# Altium schematic symbol library Molex FFC - FPC Connectors (SMT).SchLib: 638 symbols (part 10 of 10)
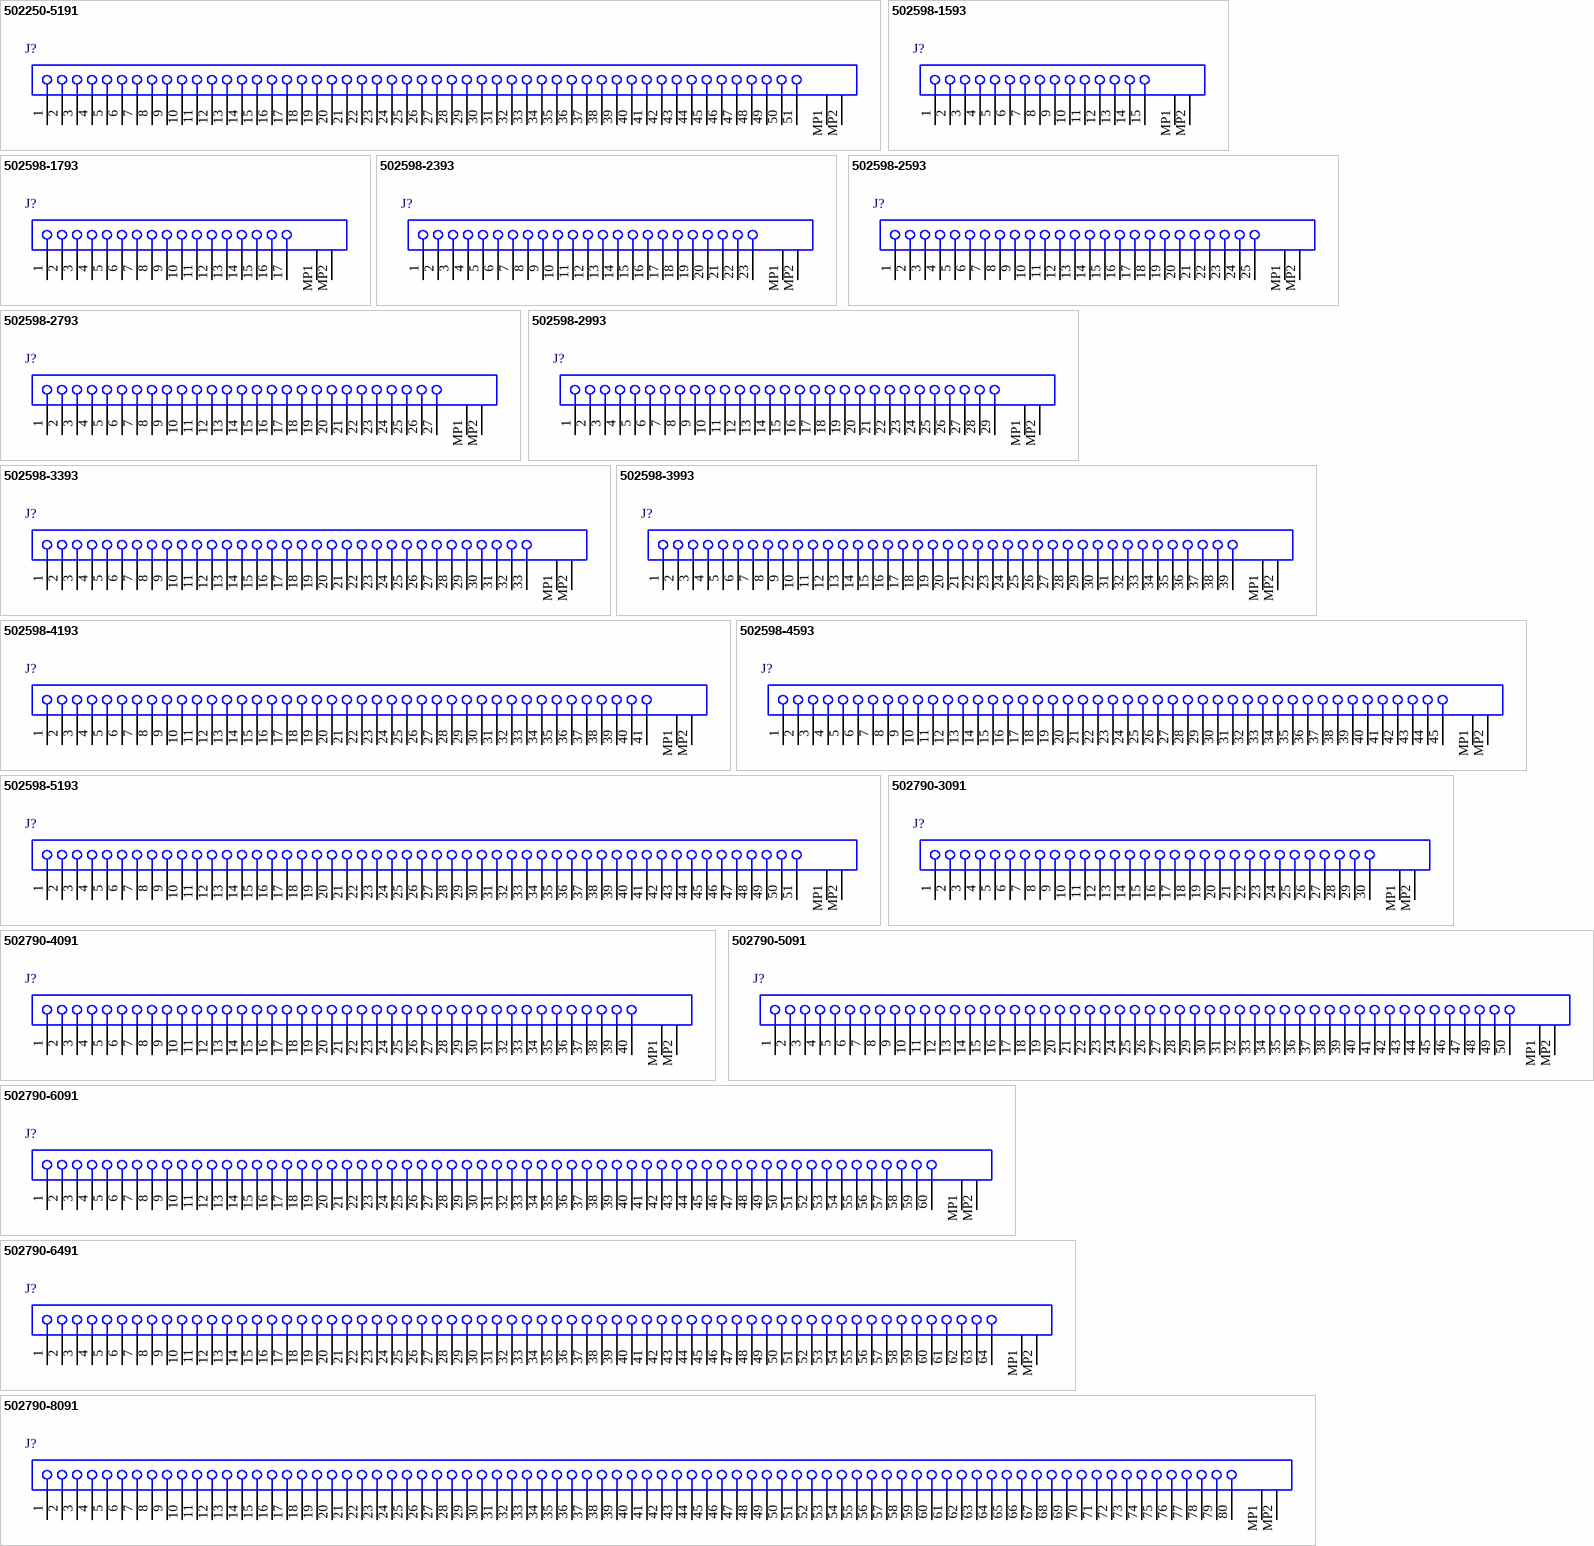
[diagram p30: symbols 502250-5191 to 502790-8091]

## 502598-5193
designator J?
0.3 mm Pitch Easy-On(TM) BackFlip(TM) Type FPC Connector, 1.15 mm Mated Height, Right Angle, SMT, Dual Contact, 51 Circuits, -40 to 85 degC, ELV and RoHS Compliant, Tape and Reel; Manufacturer: Molex; PartNumber: 502598-5193; Circuits (Loaded): 51; Current (Max per Contact): 0.2A; Durability (mating cycles max): 10; Entry Angle: 90degrees Angle; Mated Height: 1.15mm; Material - Metal: Copper Alloy, Phosphor Bronze; Material - Plating Mating: Gold; Material - Plating Termination: Gold, Tin; PCB Locator: No; PCB Retention: Yes; Pitch - Mating Interface: 0.30mm; Voltage (Max): 50V AC (RMS)/DC; PackageVersion: Rev. B, 08/2013; PackageReference: 502598-5193; PackageDescription: 51-Lead FPC Connector, Pitch 0.3 mm; Contact Position: Dual; Number of Rows: 1; Orientation: Right Angle; Packing: Tape and Reel; Polarized to PCB: Yes; RoHS: TRUE; Stackable: No; Mounting Technology: Surface Mount; ComponentLink1Description: Manufacturer URL; ComponentLink1URL: http://www.molex.com/molex/index.jsp; ComponentLink2Description: Datasheet; ComponentLink2URL: http://www.molex.com/webdocs/datasheets/pdf/en-us/5025985193_FFC_FPC_CONNECTORS.pdf; ComponentLink3Description: Package Specification; ComponentLink3URL: http://www.molex.com/pdm_docs/sd/5025985193_sd.pdf
footprint MOLX-502598-5193 (FPC Connector, 51-Leads, Right Angle, Pitch 0.3 mm, Mated Height 1.15 mm, SMT)
pins: 1, 2, 3, 4, 5, 6, 7, 8, 9, 10, 11, 12, 13, 14, 15, 16, 17, 18, 19, 20, 21, 22, 23, 24, 25, 26, 27, 28, 29, 30, 31, 32, 33, 34, 35, 36, 37, 38, 39, 40, 41, 42, 43, 44, 45, 46, 47, 48, 49, 50, 51, MP1, MP2

## 502790-3091
designator J?
0.5 mm Pitch Easy-On(TM) Front Flip Type FPC Connector, 2.5 mm Mated Height, Right Angle, ZIF, SMT, Bottom Contact, 30 Circuits, -20 to 85 degC, ELV and RoHS Compliant, Tape and Reel; Manufacturer: Molex; PartNumber: 502790-3091; Circuits (Loaded): 30; Current (Max per Contact): 0.5A; Entry Angle: 90degrees Angle; Mated Height: 2.50mm; Material - Metal: Phosphor Bronze; Material - Plating Mating: Gold; PCB Retention: Yes; Pitch - Mating Interface: 0.50mm; Stackable: No; Voltage (Max): 50V; PackageVersion: Rev. C, 05/2009; PackageReference: 502790-3091; PackageDescription: 30-Lead FPC Connector, Pitch 0.5 mm; Contact Position: Bottom; Material - Plating Termination: Gold; Number of Rows: 1; Orientation: Right Angle; Packing: Tape and Reel; Polarized to PCB: Yes; RoHS: TRUE; Mounting Technology: Surface Mount; ComponentLink1Description: Manufacturer URL; ComponentLink1URL: http://www.molex.com/molex/index.jsp; ComponentLink2Description: Datasheet; ComponentLink2URL: http://www.molex.com/webdocs/datasheets/pdf/en-us/5027903091_FFC_FPC_CONNECTORS.pdf; ComponentLink3Description: Package Specification; ComponentLink3URL: http://www.molex.com/pdm_docs/sd/5027903091_sd.pdf
footprint MOLX-502790-3091 (FPC Connector, 30-Leads, Right Angle, Pitch 0.5 mm, Mated Height 2.5 mm, SMT)
pins: 1, 2, 3, 4, 5, 6, 7, 8, 9, 10, 11, 12, 13, 14, 15, 16, 17, 18, 19, 20, 21, 22, 23, 24, 25, 26, 27, 28, 29, 30, MP1, MP2

## 502790-4091
designator J?
0.5 mm Pitch Easy-On(TM) Front Flip Type FPC Connector, 2.5 mm Mated Height, Right Angle, ZIF, SMT, Bottom Contact, 40 Circuits, -20 to 85 degC, ELV and RoHS Compliant, Tape and Reel; Manufacturer: Molex; PartNumber: 502790-4091; Circuits (Loaded): 40; Current (Max per Contact): 0.5A; Entry Angle: 90degrees Angle; Mated Height: 2.50mm; Material - Metal: Phosphor Bronze; Material - Plating Mating: Gold; PCB Retention: Yes; Pitch - Mating Interface: 0.50mm; Stackable: No; Voltage (Max): 50V; PackageVersion: Rev. C, 05/2009; PackageReference: 502790-4091; PackageDescription: 40-Lead FPC Connector, Pitch 0.5 mm; Contact Position: Bottom; Material - Plating Termination: Gold; Number of Rows: 1; Orientation: Right Angle; Packing: Tape and Reel; Polarized to PCB: Yes; RoHS: TRUE; Mounting Technology: Surface Mount; ComponentLink1Description: Manufacturer URL; ComponentLink1URL: http://www.molex.com/molex/index.jsp; ComponentLink2Description: Datasheet; ComponentLink2URL: http://www.molex.com/webdocs/datasheets/pdf/en-us/5027904091_FFC_FPC_CONNECTORS.pdf; ComponentLink3Description: Package Specification; ComponentLink3URL: http://www.molex.com/pdm_docs/sd/5027904091_sd.pdf
footprint MOLX-502790-4091 (FPC Connector, 40-Leads, Right Angle, Pitch 0.5 mm, Mated Height 2.5 mm, SMT)
pins: 1, 2, 3, 4, 5, 6, 7, 8, 9, 10, 11, 12, 13, 14, 15, 16, 17, 18, 19, 20, 21, 22, 23, 24, 25, 26, 27, 28, 29, 30, 31, 32, 33, 34, 35, 36, 37, 38, 39, 40, MP1, MP2

## 502790-5091
designator J?
0.5 mm Pitch Easy-On(TM) Front Flip Type FPC Connector, 2.5 mm Mated Height, Right Angle, ZIF, SMT, Bottom Contact, 50 Circuits, -20 to 85 degC, ELV and RoHS Compliant, Tape and Reel; Manufacturer: Molex; PartNumber: 502790-5091; Circuits (Loaded): 50; Current (Max per Contact): 0.5A; Entry Angle: 90degrees Angle; Mated Height: 2.50mm; Material - Metal: Phosphor Bronze; Material - Plating Mating: Gold; PCB Retention: Yes; Pitch - Mating Interface: 0.50mm; Stackable: No; Voltage (Max): 50V; PackageVersion: Rev. C, 05/2009; PackageReference: 502790-5091; PackageDescription: 50-Lead FPC Connector, Pitch 0.5 mm; Contact Position: Bottom; Material - Plating Termination: Gold; Number of Rows: 1; Orientation: Right Angle; Packing: Tape and Reel; Polarized to PCB: Yes; RoHS: TRUE; Mounting Technology: Surface Mount; ComponentLink1Description: Manufacturer URL; ComponentLink1URL: http://www.molex.com/molex/index.jsp; ComponentLink2Description: Datasheet; ComponentLink2URL: http://www.molex.com/webdocs/datasheets/pdf/en-us/5027905091_FFC_FPC_CONNECTORS.pdf; ComponentLink3Description: Package Specification; ComponentLink3URL: http://www.molex.com/pdm_docs/sd/5027905091_sd.pdf
footprint MOLX-502790-5091 (FPC Connector, 50-Leads, Right Angle, Pitch 0.5 mm, Mated Height 2.5 mm, SMT)
pins: 1, 2, 3, 4, 5, 6, 7, 8, 9, 10, 11, 12, 13, 14, 15, 16, 17, 18, 19, 20, 21, 22, 23, 24, 25, 26, 27, 28, 29, 30, 31, 32, 33, 34, 35, 36, 37, 38, 39, 40, 41, 42, 43, 44, 45, 46, 47, 48, 49, 50, MP1, MP2

## 502790-6091
designator J?
0.5 mm Pitch Easy-On(TM) Front Flip Type FPC Connector, 2.5 mm Mated Height, Right Angle, ZIF, SMT, Bottom Contact, 60 Circuits, -20 to 85 degC, ELV and RoHS Compliant, Tape and Reel; Manufacturer: Molex; PartNumber: 502790-6091; Circuits (Loaded): 60; Current (Max per Contact): 0.5A; Entry Angle: 90degrees Angle; Mated Height: 2.50mm; Material - Metal: Phosphor Bronze; Material - Plating Mating: Gold; PCB Retention: Yes; Pitch - Mating Interface: 0.50mm; Stackable: No; Voltage (Max): 50V; PackageVersion: Rev. C, 05/2009; PackageReference: 502790-6091; PackageDescription: 60-Lead FPC Connector, Pitch 0.5 mm; Contact Position: Bottom; Material - Plating Termination: Gold; Number of Rows: 1; Orientation: Right Angle; Packing: Tape and Reel; Polarized to PCB: Yes; RoHS: TRUE; Mounting Technology: Surface Mount; ComponentLink1Description: Manufacturer URL; ComponentLink1URL: http://www.molex.com/molex/index.jsp; ComponentLink2Description: Datasheet; ComponentLink2URL: http://www.molex.com/webdocs/datasheets/pdf/en-us/5027906091_FFC_FPC_CONNECTORS.pdf; ComponentLink3Description: Package Specification; ComponentLink3URL: http://www.molex.com/pdm_docs/sd/5027906091_sd.pdf
footprint MOLX-502790-6091 (FPC Connector, 60-Leads, Right Angle, Pitch 0.5 mm, Mated Height 2.5 mm, SMT)
pins: 1, 2, 3, 4, 5, 6, 7, 8, 9, 10, 11, 12, 13, 14, 15, 16, 17, 18, 19, 20, 21, 22, 23, 24, 25, 26, 27, 28, 29, 30, 31, 32, 33, 34, 35, 36, 37, 38, 39, 40, 41, 42, 43, 44, 45, 46, 47, 48, 49, 50, 51, 52, 53, 54, 55, 56, 57, 58, 59, 60, MP1, MP2

## 502790-6491
designator J?
0.5 mm Pitch Easy-On(TM) Front Flip Type FPC Connector, 2.5 mm Mated Height, Right Angle, ZIF, SMT, Bottom Contact, 64 Circuits, -20 to 85 degC, ELV and RoHS Compliant, Tape and Reel; Manufacturer: Molex; PartNumber: 502790-6491; Circuits (Loaded): 64; Current (Max per Contact): 0.5A; Entry Angle: 90degrees Angle; Mated Height: 2.50mm; Material - Metal: Phosphor Bronze; Material - Plating Mating: Gold; PCB Retention: Yes; Pitch - Mating Interface: 0.50mm; Stackable: No; Voltage (Max): 50V; PackageVersion: Rev. C, 05/2009; PackageReference: 502790-6491; PackageDescription: 64-Lead FPC Connector, Pitch 0.5 mm; Contact Position: Bottom; Material - Plating Termination: Gold; Number of Rows: 1; Orientation: Right Angle; Packing: Tape and Reel; Polarized to PCB: Yes; RoHS: TRUE; Mounting Technology: Surface Mount; ComponentLink1Description: Manufacturer URL; ComponentLink1URL: http://www.molex.com/molex/index.jsp; ComponentLink2Description: Datasheet; ComponentLink2URL: http://www.molex.com/webdocs/datasheets/pdf/en-us/5027906491_FFC_FPC_CONNECTORS.pdf; ComponentLink3Description: Package Specification; ComponentLink3URL: http://www.molex.com/pdm_docs/sd/5027906491_sd.pdf
footprint MOLX-502790-6491 (FPC Connector, 64-Leads, Right Angle, Pitch 0.5 mm, Mated Height 2.5 mm, SMT)
pins: 1, 2, 3, 4, 5, 6, 7, 8, 9, 10, 11, 12, 13, 14, 15, 16, 17, 18, 19, 20, 21, 22, 23, 24, 25, 26, 27, 28, 29, 30, 31, 32, 33, 34, 35, 36, 37, 38, 39, 40, 41, 42, 43, 44, 45, 46, 47, 48, 49, 50, 51, 52, 53, 54, 55, 56, 57, 58, 59, 60, 61, 62, 63, 64, MP1, MP2

## 502790-8091
designator J?
0.5 mm Pitch Easy-On(TM) Front Flip Type FPC Connector, 2.5 mm Mated Height, Right Angle, ZIF, SMT, Bottom Contact, 80 Circuits, -20 to 85 degC, ELV and RoHS Compliant, Tape and Reel; Manufacturer: Molex; PartNumber: 502790-8091; Circuits (Loaded): 80; Current (Max per Contact): 0.5A; Entry Angle: 90degrees Angle; Mated Height: 2.50mm; Material - Metal: Phosphor Bronze; Material - Plating Mating: Gold; PCB Retention: Yes; Pitch - Mating Interface: 0.50mm; Stackable: No; Voltage (Max): 50V; PackageVersion: Rev. C, 05/2009; PackageReference: 502790-8091; PackageDescription: 80-Lead FPC Connector, Pitch 0.5 mm; Contact Position: Bottom; Material - Plating Termination: Gold; Number of Rows: 1; Orientation: Right Angle; Packing: Tape and Reel; Polarized to PCB: Yes; RoHS: TRUE; Mounting Technology: Surface Mount; ComponentLink1Description: Manufacturer URL; ComponentLink1URL: http://www.molex.com/molex/index.jsp; ComponentLink2Description: Datasheet; ComponentLink2URL: http://www.molex.com/webdocs/datasheets/pdf/en-us/5027908091_FFC_FPC_CONNECTORS.pdf; ComponentLink3Description: Package Specification; ComponentLink3URL: http://www.molex.com/pdm_docs/sd/5027908091_sd.pdf
footprint MOLX-502790-8091 (FPC Connector, 80-Leads, Right Angle, Pitch 0.5 mm, Mated Height 2.5 mm, SMT)
pins: 1, 2, 3, 4, 5, 6, 7, 8, 9, 10, 11, 12, 13, 14, 15, 16, 17, 18, 19, 20, 21, 22, 23, 24, 25, 26, 27, 28, 29, 30, 31, 32, 33, 34, 35, 36, 37, 38, 39, 40, 41, 42, 43, 44, 45, 46, 47, 48, 49, 50, 51, 52, 53, 54, 55, 56, 57, 58, 59, 60, 61, 62, 63, 64, 65, 66, 67, 68, 69, 70, 71, 72, 73, 74, 75, 76, 77, 78, 79, 80, MP1, MP2

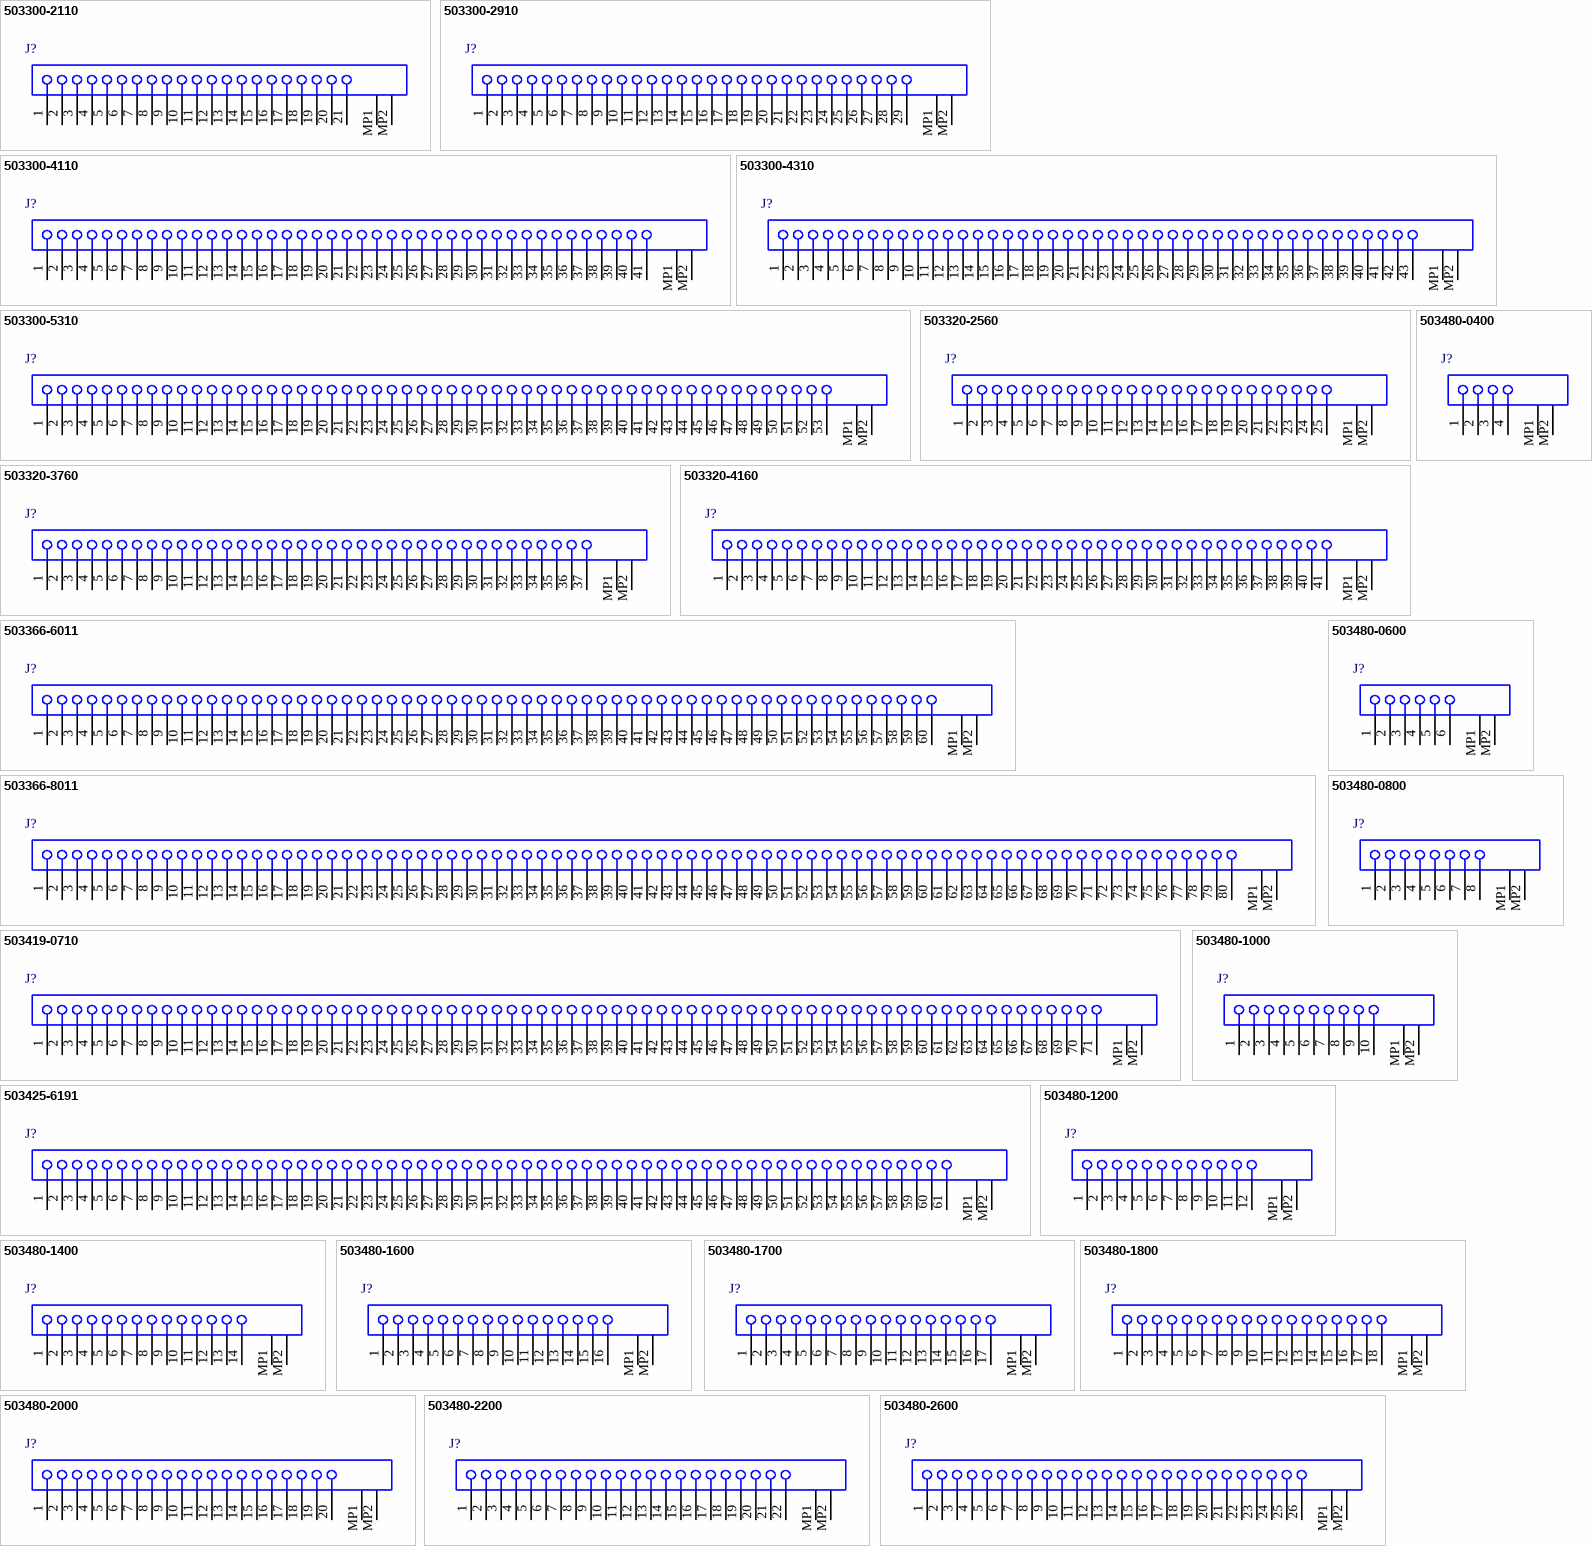
[diagram p20: symbols 503300-2110 to 503480-2600]

## 503300-2110
designator J?
0.25 mm Pitch Easy-On(TM) Front-Flip Type FPC Connector, 1.2 mm Mated Height, Right Angle, SMT, Top Contact, 21 Circuits, -40 to 80 degC, ELV and RoHS Compliant, Tray; Manufacturer: Molex; PartNumber: 503300-2110; Circuits (Loaded): 21; Current (Max per Contact): 0.2A; Durability (mating cycles max): 10; Entry Angle: 90degrees Angle; Mated Height: 1.20mm; Material - Metal: Phosphor Bronze; Material - Plating Mating: Gold over Nickel; PCB Retention: None; Pitch - Mating Interface: 0.25mm; Polarized to PCB: No; Voltage (Max): 50V AC (RMS)/DC; PackageVersion: Rev. C, 02/2014; PackageReference: 503300-2110; PackageDescription: 21-Lead FPC Connector, Pitch 0.25 mm; Contact Position: Top; Number of Rows: 1; Orientation: Right Angle; Packing: Tray; RoHS: TRUE; Stackable: No; Mounting Technology: Surface Mount; ComponentLink1Description: Manufacturer URL; ComponentLink1URL: http://www.molex.com/molex/index.jsp; ComponentLink2Description: Datasheet; ComponentLink2URL: http://www.molex.com/webdocs/datasheets/pdf/en-us/5033002110_FFC_FPC_CONNECTORS.pdf; ComponentLink3Description: Package Specification; ComponentLink3URL: http://www.molex.com/pdm_docs/sd/5033002110_sd.pdf
footprint MOLX-503300-2110 (FPC Connector, 21-Leads, Right Angle, Pitch 0.25 mm, Mated Height 1.2 mm, SMT)
pins: 1, 2, 3, 4, 5, 6, 7, 8, 9, 10, 11, 12, 13, 14, 15, 16, 17, 18, 19, 20, 21, MP1, MP2

## 503300-2910
designator J?
0.25 mm Pitch Easy-On(TM) Front-Flip Type FPC Connector, 1.2 mm Mated Height, Right Angle, SMT, Top Contact, 29 Circuits, -40 to 80 degC, ELV and RoHS Compliant, Tray; Manufacturer: Molex; PartNumber: 503300-2910; Circuits (Loaded): 29; Current (Max per Contact): 0.2A; Durability (mating cycles max): 10; Entry Angle: 90degrees Angle; Mated Height: 1.20mm; Material - Metal: Phosphor Bronze; Material - Plating Mating: Gold over Nickel; PCB Retention: None; Pitch - Mating Interface: 0.25mm; Polarized to PCB: No; Voltage (Max): 50V AC (RMS)/DC; PackageVersion: Rev. C, 02/2014; PackageReference: 503300-2910; PackageDescription: 29-Lead FPC Connector, Pitch 0.25 mm; Contact Position: Top; Number of Rows: 1; Orientation: Right Angle; Packing: Tray; RoHS: TRUE; Stackable: No; Mounting Technology: Surface Mount; ComponentLink1Description: Manufacturer URL; ComponentLink1URL: http://www.molex.com/molex/index.jsp; ComponentLink2Description: Datasheet; ComponentLink2URL: http://www.molex.com/webdocs/datasheets/pdf/en-us/5033002910_FFC_FPC_CONNECTORS.pdf; ComponentLink3Description: Package Specification; ComponentLink3URL: http://www.molex.com/pdm_docs/sd/5033002910_sd.pdf
footprint MOLX-503300-2910 (FPC Connector, 29-Leads, Right Angle, Pitch 0.25 mm, Mated Height 1.2 mm, SMT)
pins: 1, 2, 3, 4, 5, 6, 7, 8, 9, 10, 11, 12, 13, 14, 15, 16, 17, 18, 19, 20, 21, 22, 23, 24, 25, 26, 27, 28, 29, MP1, MP2

## 503300-4110
designator J?
0.25 mm Pitch Easy-On(TM) Front-Flip Type FPC Connector, 1.2 mm Mated Height, Right Angle, SMT, Top Contact, 41 Circuits, -40 to 80 degC, ELV and RoHS Compliant, Tray; Manufacturer: Molex; PartNumber: 503300-4110; Circuits (Loaded): 41; Current (Max per Contact): 0.2A; Durability (mating cycles max): 10; Entry Angle: 90degrees Angle; Mated Height: 1.20mm; Material - Metal: Phosphor Bronze; Material - Plating Mating: Gold over Nickel; PCB Retention: None; Pitch - Mating Interface: 0.25mm; Polarized to PCB: No; Voltage (Max): 50V AC (RMS)/DC; PackageVersion: Rev. C, 02/2014; PackageReference: 503300-4110; PackageDescription: 41-Lead FPC Connector, Pitch 0.25 mm; Contact Position: Top; Number of Rows: 1; Orientation: Right Angle; Packing: Tray; RoHS: TRUE; Stackable: No; Mounting Technology: Surface Mount; ComponentLink1Description: Manufacturer URL; ComponentLink1URL: http://www.molex.com/molex/index.jsp; ComponentLink2Description: Datasheet; ComponentLink2URL: http://www.molex.com/webdocs/datasheets/pdf/en-us/5033004110_FFC_FPC_CONNECTORS.pdf; ComponentLink3Description: Package Specification; ComponentLink3URL: http://www.molex.com/pdm_docs/sd/5033004110_sd.pdf
footprint MOLX-503300-4110 (FPC Connector, 41-Leads, Right Angle, Pitch 0.25 mm, Mated Height 1.2 mm, SMT)
pins: 1, 2, 3, 4, 5, 6, 7, 8, 9, 10, 11, 12, 13, 14, 15, 16, 17, 18, 19, 20, 21, 22, 23, 24, 25, 26, 27, 28, 29, 30, 31, 32, 33, 34, 35, 36, 37, 38, 39, 40, 41, MP1, MP2

## 503300-4310
designator J?
0.25 mm Pitch Easy-On(TM) Front-Flip Type FPC Connector, 1.2 mm Mated Height, Right Angle, SMT, Top Contact, 43 Circuits, -40 to 80 degC, ELV and RoHS Compliant, Tray; Manufacturer: Molex; PartNumber: 503300-4310; Circuits (Loaded): 43; Current (Max per Contact): 0.2A; Durability (mating cycles max): 10; Entry Angle: 90degrees Angle; Mated Height: 1.20mm; Material - Metal: Phosphor Bronze; Material - Plating Mating: Gold over Nickel; PCB Retention: None; Pitch - Mating Interface: 0.25mm; Polarized to PCB: No; Voltage (Max): 50V AC (RMS)/DC; PackageVersion: Rev. C, 02/2014; PackageReference: 503300-4310; PackageDescription: 43-Lead FPC Connector, Pitch 0.25 mm; Contact Position: Top; Number of Rows: 1; Orientation: Right Angle; Packing: Tray; RoHS: TRUE; Stackable: No; Mounting Technology: Surface Mount; ComponentLink1Description: Manufacturer URL; ComponentLink1URL: http://www.molex.com/molex/index.jsp; ComponentLink2Description: Datasheet; ComponentLink2URL: http://www.molex.com/webdocs/datasheets/pdf/en-us/5033004310_FFC_FPC_CONNECTORS.pdf; ComponentLink3Description: Package Specification; ComponentLink3URL: http://www.molex.com/pdm_docs/sd/5033004310_sd.pdf
footprint MOLX-503300-4310 (FPC Connector, 43-Leads, Right Angle, Pitch 0.25 mm, Mated Height 1.2 mm, SMT)
pins: 1, 2, 3, 4, 5, 6, 7, 8, 9, 10, 11, 12, 13, 14, 15, 16, 17, 18, 19, 20, 21, 22, 23, 24, 25, 26, 27, 28, 29, 30, 31, 32, 33, 34, 35, 36, 37, 38, 39, 40, 41, 42, 43, MP1, MP2

## 503300-5310
designator J?
0.25 mm Pitch Easy-On(TM) Front-Flip Type FPC Connector, 1.2 mm Mated Height, Right Angle, SMT, Top Contact, 53 Circuits, -40 to 80 degC, ELV and RoHS Compliant, Tray; Manufacturer: Molex; PartNumber: 503300-5310; Circuits (Loaded): 53; Current (Max per Contact): 0.2A; Durability (mating cycles max): 10; Entry Angle: 90degrees Angle; Mated Height: 1.20mm; Material - Metal: Phosphor Bronze; Material - Plating Mating: Gold over Nickel; PCB Retention: None; Pitch - Mating Interface: 0.25mm; Polarized to PCB: No; Voltage (Max): 50V AC (RMS)/DC; PackageVersion: Rev. C, 02/2014; PackageReference: 503300-5310; PackageDescription: 53-Lead FPC Connector, Pitch 0.25 mm; Contact Position: Top; Number of Rows: 1; Orientation: Right Angle; Packing: Tray; RoHS: TRUE; Stackable: No; Mounting Technology: Surface Mount; ComponentLink1Description: Manufacturer URL; ComponentLink1URL: http://www.molex.com/molex/index.jsp; ComponentLink2Description: Datasheet; ComponentLink2URL: http://www.molex.com/webdocs/datasheets/pdf/en-us/5033005310_FFC_FPC_CONNECTORS.pdf; ComponentLink3Description: Package Specification; ComponentLink3URL: http://www.molex.com/pdm_docs/sd/5033005310_sd.pdf
footprint MOLX-503300-5310 (FPC Connector, 53-Leads, Right Angle, Pitch 0.25 mm, Mated Height 1.2 mm, SMT)
pins: 1, 2, 3, 4, 5, 6, 7, 8, 9, 10, 11, 12, 13, 14, 15, 16, 17, 18, 19, 20, 21, 22, 23, 24, 25, 26, 27, 28, 29, 30, 31, 32, 33, 34, 35, 36, 37, 38, 39, 40, 41, 42, 43, 44, 45, 46, 47, 48, 49, 50, 51, 52, 53, MP1, MP2

## 503320-2560
designator J?
0.25 mm Pitch Easy-On(TM) Type FPC Connector, 1.65 mm Mated Height, Right Angle, SMT, Bottom Contact, 25 Circuits, -40 to 85 degC, ELV and RoHS Compliant, Tape and Reel; Manufacturer: Molex; PartNumber: 503320-2560; Circuits (Loaded): 25; Current (Max per Contact): 0.3A; Durability (mating cycles max): 10; Entry Angle: 90degrees Angle; Mated Height: 1.65mm; Material - Metal: Copper Alloy; Material - Plating Mating: Gold; PCB Locator: No; PCB Retention: Yes; Pitch - Mating Interface: 0.25mm; Voltage (Max): 50V; PackageVersion: Rev. B, 12/2011; PackageReference: 503320-2560; PackageDescription: 25-Lead FPC Connector, Pitch 0.25 mm; Contact Position: Bottom; Material - Plating Termination: Gold; Number of Rows: 1; Orientation: Right Angle; Packing: Tape and Reel; Polarized to PCB: Yes; RoHS: TRUE; Stackable: No; Mounting Technology: Surface Mount; ComponentLink1Description: Manufacturer URL; ComponentLink1URL: http://www.molex.com/molex/index.jsp; ComponentLink2Description: Datasheet; ComponentLink2URL: http://www.molex.com/webdocs/datasheets/pdf/en-us/5033202560_FFC_FPC_CONNECTORS.pdf; ComponentLink3Description: Package Specification; ComponentLink3URL: http://www.molex.com/pdm_docs/sd/5033202560_sd.pdf
footprint MOLX-503320-2560 (FPC Connector, 25-Leads, Right Angle, Pitch 0.25 mm, Mated Height 1.65 mm, SMT)
pins: 1, 2, 3, 4, 5, 6, 7, 8, 9, 10, 11, 12, 13, 14, 15, 16, 17, 18, 19, 20, 21, 22, 23, 24, 25, MP1, MP2

## 503320-3760
designator J?
0.25 mm Pitch Easy-On(TM) Type FPC Connector, 1.65 mm Mated Height, Right Angle, SMT, Bottom Contact, 37 Circuits, -40 to 85 degC, ELV and RoHS Compliant, Tape and Reel; Manufacturer: Molex; PartNumber: 503320-3760; Circuits (Loaded): 37; Current (Max per Contact): 0.3A; Durability (mating cycles max): 10; Entry Angle: 90degrees Angle; Mated Height: 1.65mm; Material - Metal: Copper Alloy; Material - Plating Mating: Gold; PCB Locator: No; PCB Retention: Yes; Pitch - Mating Interface: 0.25mm; Voltage (Max): 50V; PackageVersion: Rev. B, 12/2011; PackageReference: 503320-3760; PackageDescription: 37-Lead FPC Connector, Pitch 0.25 mm; Contact Position: Bottom; Material - Plating Termination: Gold; Number of Rows: 1; Orientation: Right Angle; Packing: Tape and Reel; Polarized to PCB: Yes; RoHS: TRUE; Stackable: No; Mounting Technology: Surface Mount; ComponentLink1Description: Manufacturer URL; ComponentLink1URL: http://www.molex.com/molex/index.jsp; ComponentLink2Description: Datasheet; ComponentLink2URL: http://www.molex.com/webdocs/datasheets/pdf/en-us/5033203760_FFC_FPC_CONNECTORS.pdf; ComponentLink3Description: Package Specification; ComponentLink3URL: http://www.molex.com/pdm_docs/sd/5033203760_sd.pdf
footprint MOLX-503320-3760 (FPC Connector, 37-Leads, Right Angle, Pitch 0.25 mm, Mated Height 1.65 mm, SMT)
pins: 1, 2, 3, 4, 5, 6, 7, 8, 9, 10, 11, 12, 13, 14, 15, 16, 17, 18, 19, 20, 21, 22, 23, 24, 25, 26, 27, 28, 29, 30, 31, 32, 33, 34, 35, 36, 37, MP1, MP2

## 503320-4160
designator J?
0.25 mm Pitch Easy-On(TM) Type FPC Connector, 1.65 mm Mated Height, Right Angle, SMT, Bottom Contact, 41 Circuits, -40 to 85 degC, ELV and RoHS Compliant, Tape and Reel; Manufacturer: Molex; PartNumber: 503320-4160; Circuits (Loaded): 41; Current (Max per Contact): 0.3A; Durability (mating cycles max): 10; Entry Angle: 90degrees Angle; Mated Height: 1.65mm; Material - Metal: Copper Alloy; Material - Plating Mating: Gold; PCB Locator: No; PCB Retention: Yes; Pitch - Mating Interface: 0.25mm; Voltage (Max): 50V; PackageVersion: Rev. B, 12/2011; PackageReference: 503320-4160; PackageDescription: 41-Lead FPC Connector, Pitch 0.25 mm; Contact Position: Bottom; Material - Plating Termination: Gold; Number of Rows: 1; Orientation: Right Angle; Packing: Tape and Reel; Polarized to PCB: Yes; RoHS: TRUE; Stackable: No; Mounting Technology: Surface Mount; ComponentLink1Description: Manufacturer URL; ComponentLink1URL: http://www.molex.com/molex/index.jsp; ComponentLink2Description: Datasheet; ComponentLink2URL: http://www.molex.com/webdocs/datasheets/pdf/en-us/5033204160_FFC_FPC_CONNECTORS.pdf; ComponentLink3Description: Package Specification; ComponentLink3URL: http://www.molex.com/pdm_docs/sd/5033204160_sd.pdf
footprint MOLX-503320-4160 (FPC Connector, 41-Leads, Right Angle, Pitch 0.25 mm, Mated Height 1.65 mm, SMT)
pins: 1, 2, 3, 4, 5, 6, 7, 8, 9, 10, 11, 12, 13, 14, 15, 16, 17, 18, 19, 20, 21, 22, 23, 24, 25, 26, 27, 28, 29, 30, 31, 32, 33, 34, 35, 36, 37, 38, 39, 40, 41, MP1, MP2

## 503366-6011
designator J?
0.5 mm Pitch Easy-On(TM) FPC Connector, 2.0 mm Mated Height, Right Angle, SMT, Bottom Contact, 60 Circuits, -20 to 85 degC, ELV and RoHS Compliant, Tape and Reel; Manufacturer: Molex; PartNumber: 503366-6011; Circuits (Loaded): 60; Current (Max per Contact): 0.5A; Durability (mating cycles max): 20; Entry Angle: Vertical; Mated Height: 2.00mm; Material - Metal: Phosphor Bronze; Material - Plating Mating: Gold over Nickel; Material - Plating Termination: Tin; PCB Locator: No; PCB Retention: Yes; Pitch - Mating Interface: 0.50mm; Voltage (Max): 50V DC; PackageVersion: Rev. A, 04/2010; PackageReference: 503366-6011; PackageDescription: 60-Lead FPC Connector, Pitch 0.5 mm; Circuits (maximum): 60; Contact Position: Bottom; Number of Rows: 1; Orientation: Right Angle; Packing: Tape and Reel; Pitch - Termination Interface: 0.50mm; Polarized to PCB: No; RoHS: TRUE; Stackable: No; Mounting Technology: Surface Mount; ComponentLink1Description: Manufacturer URL; ComponentLink1URL: http://www.molex.com/molex/index.jsp; ComponentLink2Description: Datasheet; ComponentLink2URL: http://www.molex.com/webdocs/datasheets/pdf/en-us/5033666011_FFC_FPC_CONNECTORS.pdf; ComponentLink3Description: Package Specification; ComponentLink3URL: http://www.molex.com/pdm_docs/sd/5033666011_sd.pdf
footprint MOLX-503366-6011 (FPC Connector, 60-Leads, Right Angle, Pitch 0.5 mm, Mated Height 2.0 mm, SMT)
pins: 1, 2, 3, 4, 5, 6, 7, 8, 9, 10, 11, 12, 13, 14, 15, 16, 17, 18, 19, 20, 21, 22, 23, 24, 25, 26, 27, 28, 29, 30, 31, 32, 33, 34, 35, 36, 37, 38, 39, 40, 41, 42, 43, 44, 45, 46, 47, 48, 49, 50, 51, 52, 53, 54, 55, 56, 57, 58, 59, 60, MP1, MP2

## 503366-8011
designator J?
0.5 mm Pitch Easy-On(TM) FPC Connector, 2.0 mm Mated Height, Right Angle, SMT, Bottom Contact, 80 Circuits, -20 to 85 degC, ELV and RoHS Compliant, Tape and Reel; Manufacturer: Molex; PartNumber: 503366-8011; Circuits (Loaded): 80; Current (Max per Contact): 0.5A; Durability (mating cycles max): 20; Entry Angle: Vertical; Mated Height: 2.00mm; Material - Metal: Phosphor Bronze; Material - Plating Mating: Gold over Nickel; Material - Plating Termination: Tin; PCB Locator: No; PCB Retention: Yes; Pitch - Mating Interface: 0.50mm; Voltage (Max): 50V DC; PackageVersion: Rev. A, 04/2010; PackageReference: 503366-8011; PackageDescription: 80-Lead FPC Connector, Pitch 0.5 mm; Circuits (maximum): 80; Contact Position: Bottom; Number of Rows: 1; Orientation: Right Angle; Packing: Tape and Reel; Pitch - Termination Interface: 0.50mm; Polarized to PCB: No; RoHS: TRUE; Stackable: No; Mounting Technology: Surface Mount; ComponentLink1Description: Manufacturer URL; ComponentLink1URL: http://www.molex.com/molex/index.jsp; ComponentLink2Description: Datasheet; ComponentLink2URL: http://www.molex.com/webdocs/datasheets/pdf/en-us/5033668011_FFC_FPC_CONNECTORS.pdf; ComponentLink3Description: Package Specification; ComponentLink3URL: http://www.molex.com/pdm_docs/sd/5033668011_sd.pdf
footprint MOLX-503366-8011 (FPC Connector, 80-Leads, Right Angle, Pitch 0.5 mm, Mated Height 2.0 mm, SMT)
pins: 1, 2, 3, 4, 5, 6, 7, 8, 9, 10, 11, 12, 13, 14, 15, 16, 17, 18, 19, 20, 21, 22, 23, 24, 25, 26, 27, 28, 29, 30, 31, 32, 33, 34, 35, 36, 37, 38, 39, 40, 41, 42, 43, 44, 45, 46, 47, 48, 49, 50, 51, 52, 53, 54, 55, 56, 57, 58, 59, 60, 61, 62, 63, 64, 65, 66, 67, 68, 69, 70, 71, 72, 73, 74, 75, 76, 77, 78, 79, 80, MP1, MP2

## 503419-0710
designator J?
0.2 mm Pitch Easy-On(TM) Front Flip Actuator Type FPC Connector, 0.9 mm Mated Height, Right Angle, ZIF, SMT, Bottom Contact, 71 Circuits, -40 to 85 degC, ELV and RoHS Compliant, Tape and Reel; Manufacturer: Molex; PartNumber: 503419-0710; Circuits (Loaded): 71; Current (Max per Contact): 0.2A; Durability (mating cycles max): 10; Entry Angle: 90degrees Angle; Mated Height: 0.90mm; Material - Metal: Copper Alloy; Material - Plating Mating: Gold; PCB Locator: No; PCB Retention: Yes; Pitch - Mating Interface: 0.20mm; Voltage (Max): 50V; PackageVersion: Rev. B, 08/2013; PackageReference: 503419-0710; PackageDescription: 71-Lead FPC Connector, Pitch 0.2 mm; Contact Position: Bottom; Material - Plating Termination: Gold; Number of Rows: 1; Orientation: Right Angle; Packing: Tape and Reel; Pitch - Termination Interface: 0.20mm; Polarized to PCB: Yes; RoHS: TRUE; Stackable: No; Mounting Technology: Surface Mount; ComponentLink1Description: Manufacturer URL; ComponentLink1URL: http://www.molex.com/molex/index.jsp; ComponentLink2Description: Datasheet; ComponentLink2URL: http://www.molex.com/webdocs/datasheets/pdf/en-us/5034190710_FFC_FPC_CONNECTORS.pdf; ComponentLink3Description: Package Specification; ComponentLink3URL: http://www.molex.com/pdm_docs/sd/5034190710_sd.pdf
footprint MOLX-503419-0710 (FPC Connector, 71-Leads, Right Angle, Pitch 0.2 mm, Mated Height 0.9 mm, SMT)
pins: 1, 2, 3, 4, 5, 6, 7, 8, 9, 10, 11, 12, 13, 14, 15, 16, 17, 18, 19, 20, 21, 22, 23, 24, 25, 26, 27, 28, 29, 30, 31, 32, 33, 34, 35, 36, 37, 38, 39, 40, 41, 42, 43, 44, 45, 46, 47, 48, 49, 50, 51, 52, 53, 54, 55, 56, 57, 58, 59, 60, 61, 62, 63, 64, 65, 66, 67, 68, 69, 70, 71, MP1, MP2

## 503425-6191
designator J?
0.3 mm Pitch Easy-On(TM) BackFlip(TM) Type FPC Connector, 0.9 mm Mated Height, Right Angle, SMT, Dual Contact, 61 Circuits, -40 to 85 degC, ELV and RoHS Compliant, Tape and Reel; Manufacturer: Molex; PartNumber: 503425-6191; Circuits (Loaded): 61; Current (Max per Contact): 0.2A; Durability (mating cycles max): 10; Entry Angle: 90degrees Angle; Mated Height: 0.90mm; Material - Metal: Copper-Nickel-Tin; Material - Plating Mating: Gold; PCB Locator: No; PCB Retention: Yes; Pitch - Mating Interface: 0.30mm; Voltage (Max): 50V AC (RMS)/DC; PackageVersion: Rev. 0, 05/2010; PackageReference: 503425-6191; PackageDescription: 61-Lead FPC Connector, Pitch 0.3 mm; Contact Position: Dual; Material - Plating Termination: Gold; Number of Rows: 1; Orientation: Right Angle; Packing: Tape and Reel; Polarized to PCB: Yes; RoHS: TRUE; Stackable: No; Mounting Technology: Surface Mount; ComponentLink1Description: Manufacturer URL; ComponentLink1URL: http://www.molex.com/molex/index.jsp; ComponentLink2Description: Datasheet; ComponentLink2URL: http://www.molex.com/webdocs/datasheets/pdf/en-us/5034256191_FFC_FPC_CONNECTORS.pdf; ComponentLink3Description: Package Specification; ComponentLink3URL: http://www.molex.com/pdm_docs/sd/5034256191_sd.pdf
footprint MOLX-503425-6191 (FPC Connector, 61-Leads, Right Angle, Pitch 0.3 mm, Mated Height 0.9 mm, SMT)
pins: 1, 2, 3, 4, 5, 6, 7, 8, 9, 10, 11, 12, 13, 14, 15, 16, 17, 18, 19, 20, 21, 22, 23, 24, 25, 26, 27, 28, 29, 30, 31, 32, 33, 34, 35, 36, 37, 38, 39, 40, 41, 42, 43, 44, 45, 46, 47, 48, 49, 50, 51, 52, 53, 54, 55, 56, 57, 58, 59, 60, 61, MP1, MP2
